# Altium footprint library SMD_Connectors.PcbLib: 28 footprints (part 2 of 2)
Each footprint in its own frame and in the unit in brackets; x right, y up, seen from the top. Pads: shape width x height; smd on the part's side, far side on the other; paste and mask are expansions set on the pad; w line width, h text height; cw(c..) or ccw(c..) is an arc to the next point about the centre after c.
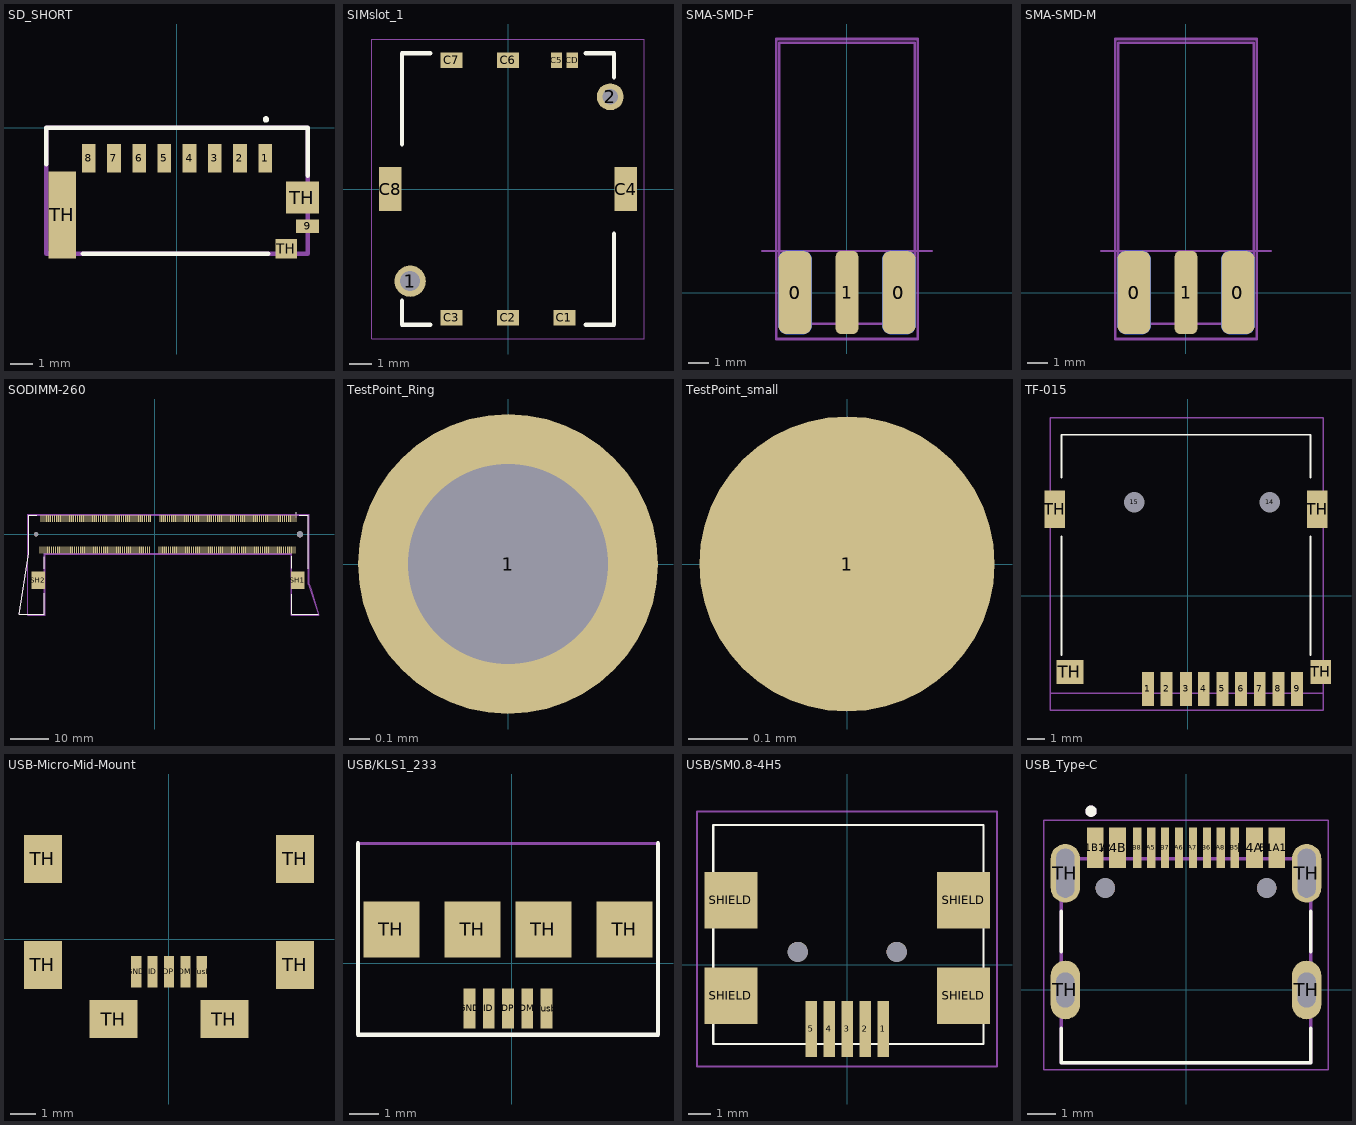
[diagram p1: the footprints below, top view; thin cyan lines are the x and y axes]

## SD_SHORT [mm]
pads (12):
  rect 0.6x1.25 smd: 1(3.85,-1.325) 2(2.75,-1.325) 3(1.65,-1.325) 4(0.55,-1.325) 5(-0.55,-1.325) 6(-1.65,-1.325) 7(-2.75,-1.325) 8(-3.85,-1.325)
  rect 1x0.6 smd: 9(5.7,-4.3)
  rect 1.2x3.79 smd: TH(-5,-3.805)
  rect 0.95x0.85 smd: TH(4.775,-5.275)
  rect 1.45x1.4 smd: TH(5.475,-3.05)
Top Overlay:
  circle w0.2: c3.886,0.364 r0.041
  lines w0.2: -5.7,-1.599 -5.7,0 5.7,0 5.7,-2.098 ; -4.1,-5.5 3.978,-5.5
Top Assembly:
  lines w0.2: -5.7,-5.5 5.7,-5.5 5.7,0 -5.7,0 -5.7,-5.5
3D body "47309-2651.stp": height 2.7, standoff 0.05, extent -5.4,-5.475 6,0.025

## SIMslot_1 [mm]
pads (11):
  round 1.408 hole 0.9: 1(-4.4,-4.15)
  round 1.208 hole 0.7: 2(4.6,4.15)
  rect 1x0.7 smd: C1(2.54,-5.795) C2(0,-5.795) C3(-2.54,-5.795) C6(0,5.795) C7(-2.54,5.795)
  rect 1x2 smd: C4(5.3,0) C8(-5.3,0)
  rect 0.5x0.7 smd: C5(2.19,5.795) CD(2.89,5.795)
Top Overlay:
  lines w0.2: -4.77,-5.02 -4.77,-6.1 -3.5,-6.1 ; -4.77,2.02 -4.77,6.1 -3.5,6.1 ; 3.5,-6.1 4.77,-6.1 4.77,-2.02 ; 3.5,6.1 4.77,6.1 4.77,5.02
Top Assembly:
  lines w0.05: -6.125,-6.75 -6.125,6.75 6.125,6.75 6.125,-6.75 -6.125,-6.75

## SMA-SMD-F [mm]
pads (5):
  rrect50% 1.6x4 smd: 0(-2.5,0) 0(2.5,0)
  rrect50% 1.6x4 smd far side: 0(-2.5,0) 0(2.5,0)
  rrect50% 1.1x4 smd: 1(0,0)
Mechanical 1:
  lines w0.1: -4.1,2 4.1,2
Top Assembly (Mech13):
  lines w0.127: -3.256,-1.504 -3.256,12.013 3.264,12.013 3.264,-1.504 -3.256,-1.504
Top Courtyard (Mech15):
  lines w0.127: -3.4,-2.235 -3.4,12.2 3.4,12.2 3.4,-2.235 -3.4,-2.235
3D body "c-1045351-1.STEP": height 4.17, standoff -3.17, extent -3.175,5 3.175,16.354
3D body "SMA_female_edge_6.5x6.5.step": height 3.8, standoff -2.7, extent -3.25,-1.5 3.25,12

## SMA-SMD-M [mm]
pads (5):
  rrect50% 1.6x4 smd far side: 0(-2.5,0) 0(2.5,0)
  rrect50% 1.6x4 smd: 0(-2.5,0) 0(2.5,0)
  rrect50% 1.1x4 smd: 1(0,0)
Mechanical 1:
  lines w0.1: -4.1,2 4.1,2
Top Assembly (Mech13):
  lines w0.127: -3.256,-1.504 3.264,-1.504 3.264,12.013 -3.256,12.013 -3.256,-1.504
Top Courtyard (Mech15):
  lines w0.127: -3.4,-2.235 3.4,-2.235 3.4,12.2 -3.4,12.2 -3.4,-2.235
3D body "SMA_female_edge_6.5x6.5.step": height 3.8, standoff -2.7, extent -3.25,-1.5 3.25,12
3D body "c-1045351-1.STEP": height 4.17, standoff -3.17, extent -3.175,5 3.175,16.354

## SODIMM-260 [mm]
pads (264):
  rect 0.3x1.75 smd: 1(36.875,4.1) 2(36.625,-4.1) 3(36.375,4.1) 4(36.125,-4.1) 5(35.875,4.1) 6(35.625,-4.1) 7(35.375,4.1) 8(35.125,-4.1) 9(34.875,4.1) 10(34.625,-4.1) 11(34.375,4.1) 12(34.125,-4.1) 13(33.875,4.1) 14(33.625,-4.1) 15(33.375,4.1) 16(33.125,-4.1) 17(32.875,4.1) 18(32.625,-4.1) 19(32.375,4.1) 20(32.125,-4.1) 21(31.875,4.1) 22(31.625,-4.1) 23(31.375,4.1) 24(31.125,-4.1) 25(30.875,4.1) 26(30.625,-4.1) 27(30.375,4.1) 28(30.125,-4.1) 29(29.875,4.1) 30(29.625,-4.1) 31(29.375,4.1) 32(29.125,-4.1) 33(28.875,4.1) 34(28.625,-4.1) 35(28.375,4.1) 36(28.125,-4.1) 37(27.875,4.1) 38(27.625,-4.1) 39(27.375,4.1) 40(27.125,-4.1) 41(26.875,4.1) 42(26.625,-4.1) 43(26.375,4.1) 44(26.125,-4.1) 45(25.875,4.1) 46(25.625,-4.1) 47(25.375,4.1) 48(25.125,-4.1) 49(24.875,4.1) 50(24.625,-4.1) 51(24.375,4.1) 52(24.125,-4.1) 53(23.875,4.1) 54(23.625,-4.1) 55(23.375,4.1) 56(23.125,-4.1) 57(22.875,4.1) 58(22.625,-4.1) 59(22.375,4.1) 60(22.125,-4.1) 61(21.875,4.1) 62(21.625,-4.1) 63(21.375,4.1) 64(21.125,-4.1) 65(20.875,4.1) 66(20.625,-4.1) 67(20.375,4.1) 68(20.125,-4.1) 69(19.875,4.1) 70(19.625,-4.1) 71(19.375,4.1) 72(19.125,-4.1) 73(18.875,4.1) 74(18.625,-4.1) 75(18.375,4.1) 76(18.125,-4.1) 77(17.875,4.1) 78(17.625,-4.1) 79(17.375,4.1) 80(17.125,-4.1) 81(16.875,4.1) 82(16.625,-4.1) 83(16.375,4.1) 84(16.125,-4.1) 85(15.875,4.1) 86(15.625,-4.1) 87(15.375,4.1) 88(15.125,-4.1) 89(14.875,4.1) 90(14.625,-4.1) 91(14.375,4.1) 92(14.125,-4.1) 93(13.875,4.1) 94(13.625,-4.1) 95(13.375,4.1) 96(13.125,-4.1) 97(12.875,4.1) 98(12.625,-4.1) 99(12.375,4.1) 100(12.125,-4.1) 101(11.875,4.1) 102(11.625,-4.1) 103(11.375,4.1) 104(11.125,-4.1) 105(10.875,4.1) 106(10.625,-4.1) 107(10.375,4.1) 108(10.125,-4.1) 109(9.875,4.1) 110(9.625,-4.1) 111(9.375,4.1) 112(9.125,-4.1) 113(8.875,4.1) 114(8.625,-4.1) 115(8.375,4.1) 116(8.125,-4.1) 117(7.875,4.1) 118(7.625,-4.1) 119(7.375,4.1) 120(7.125,-4.1) 121(6.875,4.1) 122(6.625,-4.1) 123(6.375,4.1) 124(6.125,-4.1) 125(5.875,4.1) 126(5.625,-4.1) 127(5.375,4.1) 128(5.125,-4.1) 129(4.875,4.1) 130(4.625,-4.1) 131(4.375,4.1) 132(4.125,-4.1) 133(3.875,4.1) 134(3.625,-4.1) 135(3.375,4.1) 136(3.125,-4.1) 137(2.875,4.1) 138(2.625,-4.1) 139(2.375,4.1) 140(2.125,-4.1) 141(1.875,4.1) 142(1.625,-4.1) 143(1.375,4.1) 144(1.125,-4.1) 145(-1.125,4.1) 146(-1.375,-4.1) 147(-1.625,4.1) 148(-1.875,-4.1) 149(-2.125,4.1) 150(-2.375,-4.1) 151(-2.625,4.1) 152(-2.875,-4.1) 153(-3.125,4.1) 154(-3.375,-4.1) 155(-3.625,4.1) 156(-3.875,-4.1) 157(-4.125,4.1) 158(-4.375,-4.1) 159(-4.625,4.1) 160(-4.875,-4.1) 161(-5.125,4.1) 162(-5.375,-4.1) 163(-5.625,4.1) 164(-5.875,-4.1) 165(-6.125,4.1) 166(-6.375,-4.1) 167(-6.625,4.1) 168(-6.875,-4.1) 169(-7.125,4.1) 170(-7.375,-4.1) 171(-7.625,4.1) 172(-7.875,-4.1) 173(-8.125,4.1) 174(-8.375,-4.1) 175(-8.625,4.1) 176(-8.875,-4.1) 177(-9.125,4.1) 178(-9.375,-4.1) 179(-9.625,4.1) 180(-9.875,-4.1) 181(-10.125,4.1) 182(-10.375,-4.1) 183(-10.625,4.1) 184(-10.875,-4.1) 185(-11.125,4.1) 186(-11.375,-4.1) 187(-11.625,4.1) 188(-11.875,-4.1) 189(-12.125,4.1) 190(-12.375,-4.1) 191(-12.625,4.1) 192(-12.875,-4.1) 193(-13.125,4.1) 194(-13.375,-4.1) 195(-13.625,4.1) 196(-13.875,-4.1) 197(-14.125,4.1) 198(-14.375,-4.1) 199(-14.625,4.1) 200(-14.875,-4.1) 201(-15.125,4.1) 202(-15.375,-4.1) 203(-15.625,4.1) 204(-15.875,-4.1) 205(-16.125,4.1) 206(-16.375,-4.1) 207(-16.625,4.1) 208(-16.875,-4.1) 209(-17.125,4.1) 210(-17.375,-4.1) 211(-17.625,4.1) 212(-17.875,-4.1) 213(-18.125,4.1) 214(-18.375,-4.1) 215(-18.625,4.1) 216(-18.875,-4.1) 217(-19.125,4.1) 218(-19.375,-4.1) 219(-19.625,4.1) 220(-19.875,-4.1) 221(-20.125,4.1) 222(-20.375,-4.1) 223(-20.625,4.1) 224(-20.875,-4.1) 225(-21.125,4.1) 226(-21.375,-4.1) 227(-21.625,4.1) 228(-21.875,-4.1) 229(-22.125,4.1) 230(-22.375,-4.1) 231(-22.625,4.1) 232(-22.875,-4.1) 233(-23.125,4.1) 234(-23.375,-4.1) 235(-23.625,4.1) 236(-23.875,-4.1) 237(-24.125,4.1) 238(-24.375,-4.1) 239(-24.625,4.1) 240(-24.875,-4.1) 241(-25.125,4.1) 242(-25.375,-4.1) 243(-25.625,4.1) 244(-25.875,-4.1) 245(-26.125,4.1) 246(-26.375,-4.1) 247(-26.625,4.1) 248(-26.875,-4.1) 249(-27.125,4.1) 250(-27.375,-4.1) 251(-27.625,4.1) 252(-27.875,-4.1) 253(-28.125,4.1) 254(-28.375,-4.1) 255(-28.625,4.1) 256(-28.875,-4.1) 257(-29.125,4.1) 258(-29.375,-4.1) 259(-29.625,4.1) 260(-29.875,-4.1)
  rect 3.5x4.6 smd: SH1(37.3,-12) SH2(-30.3,-12)
  round 1.1 hole 1.1 unplated: ""(-30.9,0)
  round 1.6 hole 1.6 unplated: ""(37.9,0)
Top Overlay:
  circle w0.2: c36.875,5.5 r0.1
  lines w0.127: -30.725,5 -32.875,5 -32.875,-5 -35.375,-20.85 -28.825,-20.85 -28.825,-15.402 ; -28.825,-9 -28.825,-5.85 ; 35.825,-15.6 35.825,-20.85 42.625,-20.85 ; 35.825,-8.85 35.825,-5.7 ; 37.725,5 40.125,5 40.125,-9.031
Top Assembly (Mech13):
  circle w0.1: c36.875,4.5 r0.05
  lines w0.127: -35.375,-20.85 -28.825,-20.85 -28.825,-5 35.825,-5 35.825,-20.85 42.625,-20.85 40.125,-13.031 40.125,5 -32.875,5 ccw(c-32.802,4.928) -32.875,4.855 -32.875,-5.08 -35.375,-20.85
Top Courtyard (Mech15):
  lines w0.05: -33.125,-21.1 -33.125,5.25 40.375,5.25 40.375,-13.081 40.875,-14.531 42.875,-21.1 35.575,-21.1 35.575,-5.25 -28.575,-5.25 -28.575,-21.1 -33.125,-21.1
3D body "c-2309407-1-1-3d.stp": height 4.15, standoff -0.35, extent -33,-20.85 40,5

## TestPoint_Ring [mm]
pads (1):
  round 1.5 hole 1 mask-0.13: 1(0,0)
3D body "testpin red 1mm.stp": height 5, standoff -2.53, extent -1.15,-1.15 1.15,1.15

## TestPoint_small [mm]
pads (1):
  round 0.5 smd mask-0.13: 1(0,0)

## TF-015 [mm]
pads (15):
  rect 0.7x2 smd: 1(-2.35,-5.504) 2(-1.25,-5.504) 3(-0.1,-5.504) 4(0.95,-5.504) 5(2.05,-5.504) 6(3.15,-5.504) 7(4.25,-5.504) 8(5.35,-5.504) 9(6.45,-5.504)
  round 0.6 hole 1.2 unplated: 14(4.85,5.504) 15(-3.15,5.504)
  rect 1.2x2.2 smd: TH(-7.85,5.104) TH(7.65,5.104)
  rect 1.6x1.4 smd: TH(-6.95,-4.496)
  rect 1.2x1.4 smd: TH(7.85,-4.496)
Top Overlay:
  lines w0.1: -7.45,-3.496 -7.45,3.504 ; -7.45,6.964 -7.45,9.504 7.25,9.504 7.25,6.964 ; 7.25,-3.496 7.25,3.504
Top Assembly:
  lines w0.1: -8.104,-5.75 8,-5.75 8,10.491 -8.104,10.491 -8.104,-5.75
Top Courtyard:
  lines w0.1: -8.104,-6.75 8,-6.75 8,10.491 -8.104,10.491 -8.104,-6.75
3D body "User Library-Socket-MicroSD.STEP": height 2.04, standoff -0.41, extent -8.1,-5.746 7.9,11.304

## USB-Micro-Mid-Mount [mm]
pads (11):
  rect 0.4x1.25 smd: DM(0.65,-1.3) DP(0,-1.3) GND(-1.3,-1.3) ID(-0.65,-1.3) Vusb(1.3,-1.3)
  rect 1.5x1.9 smd: TH(-5,-1.025) TH(-5,3.175) TH(5,-1.025) TH(5,3.175)
  rect 1.9x1.5 smd: TH(-2.2,-3.175) TH(2.2,-3.175)
3D body "474910001.stp": height 1.48, standoff -1.47, extent -5.5,-3.575 5.5,5.555

## USB/KLS1_233 [mm]
pads (9):
  rect 0.4x1.35 smd: DM(0.523,-1.526) DP(-0.127,-1.526) GND(-1.427,-1.526) ID(-0.777,-1.526) Vusb(1.173,-1.526)
  rect 1.9x1.9 smd: TH(-4.077,1.149) TH(-1.327,1.149) TH(1.073,1.149) TH(3.823,1.149)
Top Overlay:
  lines w0.15: -5.207,4.064 -5.207,-2.413 -3.81,-2.413 3.59,-2.413 4.953,-2.413 4.953,4.064
Top Assembly (Mech13):
  lines w0.1: -5.207,-2.413 4.953,-2.413 4.953,4.064 -5.207,4.064 -5.207,-2.413
3D body "zx62-b-5pa_33_.stp": height 2.78, standoff -0.17, extent -4.164,-1.526 3.91,4.074

## USB/SM0.8-4H5 [mm]
pads (11):
  rect 0.5x2.5 smd: 1(1.6,-2.862) 2(0.8,-2.862) 3(0,-2.862) 4(-0.8,-2.862) 5(-1.6,-2.862)
  rect 2.35x2.5 smd: SHIELD(-5.175,-1.388) SHIELD(-5.175,2.863) SHIELD(5.175,-1.388) SHIELD(5.175,2.863)
  round 0.9 hole 0.9: ""(-2.2,0.563) ""(2.2,0.563)
Top Overlay:
  lines w0.1: -5.961,-3.539 6.064,-3.539 6.064,6.211 -5.961,6.211 -5.961,-3.539
Top Assembly:
  lines w0.1: -6.686,-4.539 -6.686,6.811 6.664,6.811 6.664,-4.539 -6.686,-4.539
3D body "USBminiAB.stp": height 3.95, standoff 0, extent -5.025,-2.137 4.875,6.863

## USB_Type-C [mm]
pads (18):
  rect 0.6x1.45 smd: A1B12(-3.25,5.095) A4B9(-2.45,5.095) B1A12(3.25,5.095) B4A9(2.45,5.095)
  rect 0.3x1.45 smd: A5(-1.25,5.095) A6(-0.25,5.095) A7(0.25,5.095) A8(1.25,5.095) B5(1.75,5.095) B6(0.75,5.095) B7(-0.75,5.095) B8(-1.75,5.095)
  oval 1.05x2.1 hole 0.65 slot 1.25 at 90 deg: TH(-4.32,0) TH(4.32,0)
  oval 1.05x2.1 hole 0.65 slot 1.75 at 90 deg: TH(-4.32,4.18) TH(4.32,4.18)
  round 0.7 hole 0.7 unplated: ""(-2.89,3.65) ""(2.89,3.65)
Top Overlay:
  circle w0.2: c-3.4,6.4 r0.1
  lines w0.127: -4.47,-1.37 -4.47,-2.6 4.47,-2.6 4.47,-1.37 ; -4.47,1.37 -4.47,2.81 ; 4.47,1.37 4.47,2.81
Top Assembly (Mech13):
  circle w0.2: c-3.4,6.4 r0.1
  lines w0.127: -4.47,-2.6 4.47,-2.6 4.47,4.7 -4.47,4.7 -4.47,-2.6
Top Courtyard (Mech15):
  lines w0.05: -5.095,-2.85 5.095,-2.85 5.095,6.07 -5.095,6.07 -5.095,-2.85